# Altium footprint library lib_datalogger.PcbLib: 866 footprints (part 18 of 55)
Each footprint in its own frame and in the unit in brackets; x right, y up, seen from the top. Pads: shape width x height; smd on the part's side, far side on the other; paste and mask are expansions set on the pad; w line width, h text height; cw(c..) or ccw(c..) is an arc to the next point about the centre after c.
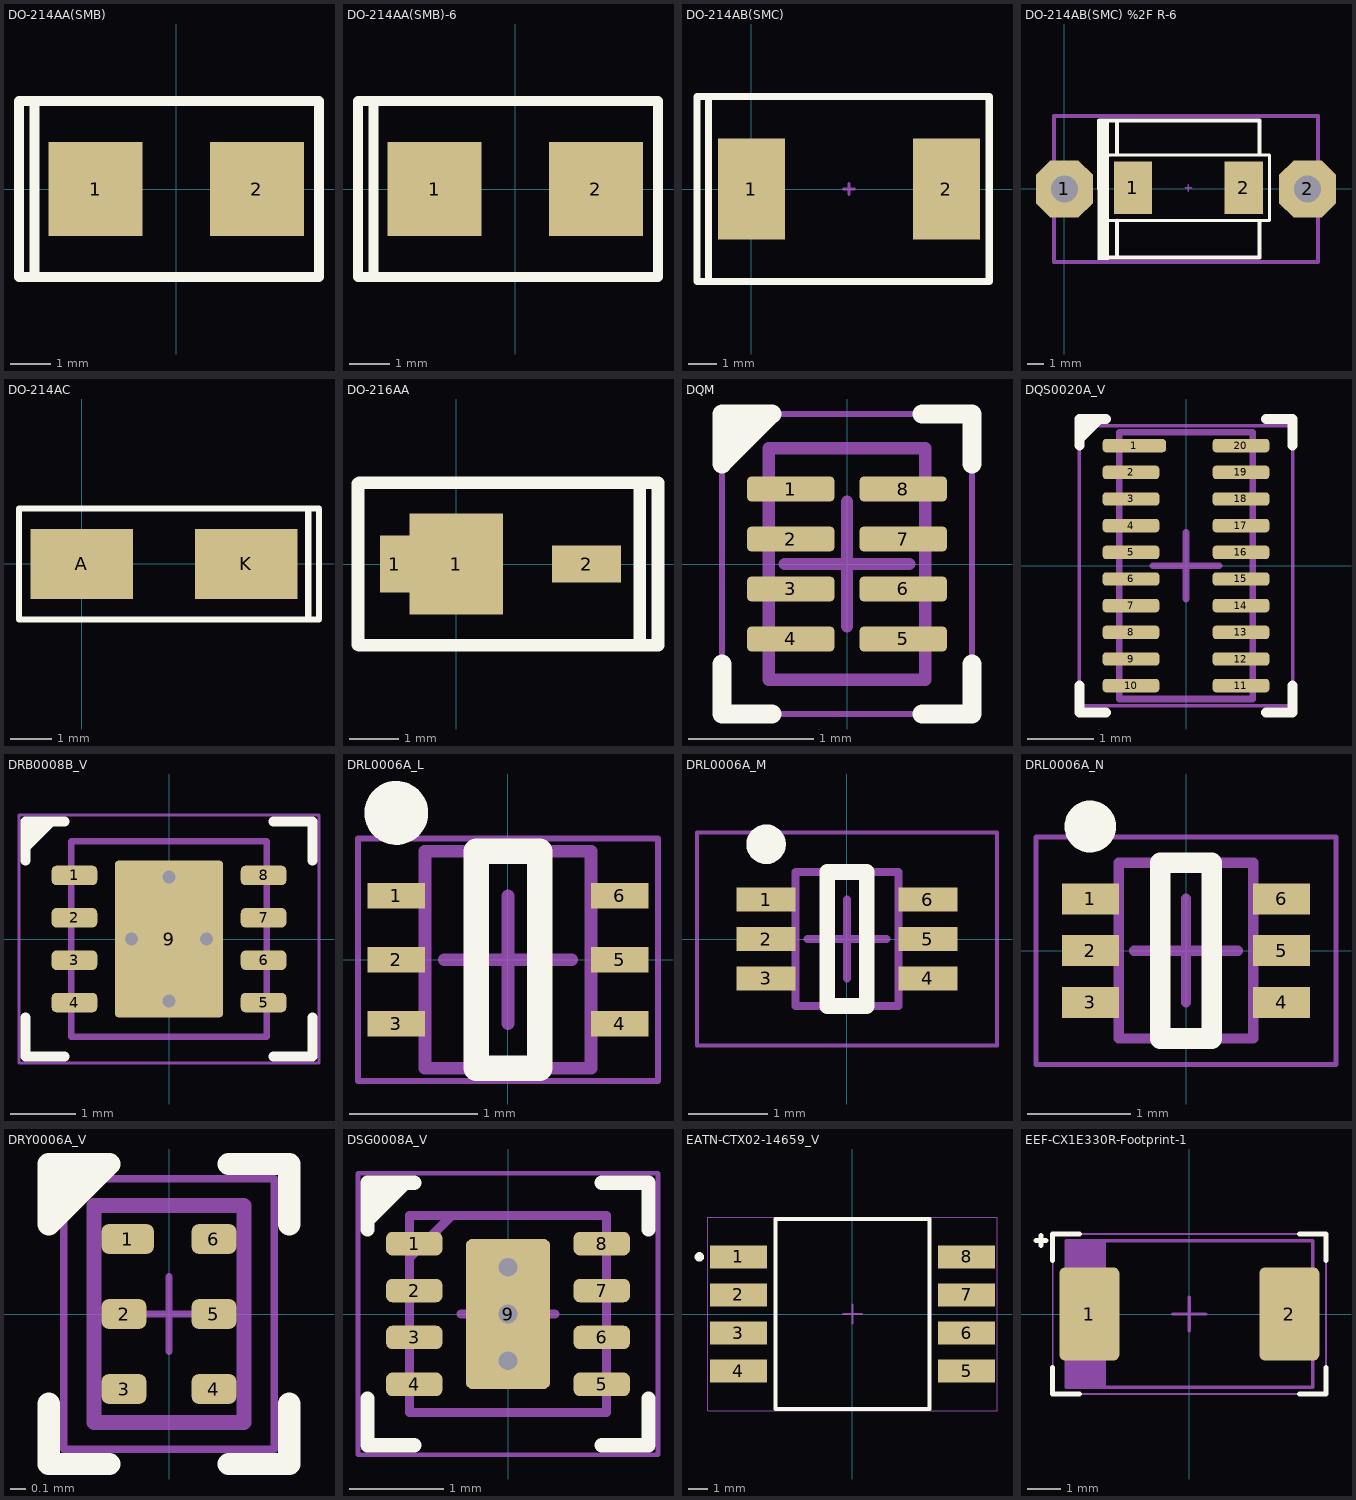
[diagram p17: the footprints below, top view; thin cyan lines are the x and y axes]

## DO-214AA(SMB) [mm]
pads (2):
  rect 2.3x2.3 smd: 1(-1.981,0) 2(1.981,0)
Top Overlay:
  lines w0.254: -3.48,-2.032 -3.48,2.032 ; -3.861,-2.159 -3.861,2.159 3.505,2.159 3.505,-2.159 -3.861,-2.159
3D body "DO-214AA.step": height 2.45, standoff 0.03, extent -2.674,-1.95 2.826,1.95

## DO-214AA(SMB)-6 [mm]
pads (2):
  rect 2.3x2.3 smd: 1(-1.981,0) 2(1.981,0)
Top Overlay:
  lines w0.254: -3.48,-2.032 -3.48,2.032 ; -3.861,-2.159 3.505,-2.159 3.505,2.159 -3.861,2.159 -3.861,-2.159
3D body "DO-214AA.step": height 2.45, standoff 0.03, extent -2.674,-1.95 2.826,1.95

## DO-214AB(SMC) [mm]
pads (2):
  rect 2.4x3.6 smd: 1(0,0) 2(6.95,0)
Top Overlay:
  lines w0.254: -1.524,-3.302 -1.524,3.302 ; -1.94,-3.302 8.474,-3.302 8.474,3.302 -1.94,3.302 -1.94,2.032 -1.94,-2.032 -1.94,-3.302
Mechanical 1:
  lines w0.1: 3.275,0 3.675,0 ; 3.475,-0.2 3.475,0.2
3D body "smc.step": height 2.4, standoff 0.03, extent -0.59,-3.05 7.54,3.05

## DO-214AB(SMC) %2F R-6 [mil]
pads (4):
  oct 140x140 hole 66: 1(0,0) 2(600,0)
  rect 94.49x129.92 smd: 1(169.19,3) 2(442.81,3)
Top Layer:
  lines w10: 130,-79 131,-78
Top Overlay:
  region: 110,171 110,-174 82,-174 81,171
  lines w7.87: 110.13,-77.91 92.42,-59.99 92.42,65.99 110.13,83.71 212.5,83.71 ; 110.13,-77.71 403,-77.71 ; 210,83.71 505.8,83.71 505.8,-77.71 399.5,-77.71
  lines w10: 86,169 479,169 ; 94,-169 481,-169 481,-79 ; 130,-169 130,-79 ; 130,85 130,169 ; 481,86 481,169
Mechanical 1:
  lines w3.94: 298.13,3 313.87,3 ; 306,-4.87 306,10.87
  lines w10: -25.59,-179.53 625.59,-179.53 625.59,179.52 -25.59,179.52 -25.59,-179.53
3D body "smc.step": height 94.49, standoff 1.29, extent 145.96,-117.08 466.04,123.08
3D body "User Library-Diode R-6 diameter 9_1 pitch 600mils.step": height 494.49, standoff -84.65, extent -25.59,-179.53 625.59,179.52

## DO-214AC [mm] "RM2000E-TP FOOTPRINT"
height 2.44
pads (2):
  rect 2.5x1.7 smd: A(0,0) K(4,0)
Top Overlay:
  lines w0.152: 5.509,-1.34 5.509,1.342 ; -1.524,-1.35 5.769,-1.35 5.769,1.35 -1.524,1.35 -1.524,-1.35
3D body "User Library-DO-214AC_SMA.STEP": height 2.15, standoff -0.05, extent -0.468,-1.35 4.532,1.35

## DO-216AA [mm]
pads (3):
  rect 0.6x1.15 smd: 1(-1.245,0)
  rect 1.9x2.05 smd: 1(0,0)
  rect 1.4x0.75 smd: 2(2.64,0)
Top Overlay:
  lines w0.254: -1.995,-1.639 -1.995,1.626 ; -1.969,-1.651 3.708,-1.651 ; -1.969,1.651 4.089,1.651 4.089,-1.651 3.72,-1.651 3.72,1.639 3.72,-1.626 ; 1.397,1.651 3.708,1.651
3D body "DO-216AA.step": height 1.01, standoff 0, extent -1.056,-1 2.794,1

## DQM [mm] "R-PX2SON-N8"
height 0.4
pads (8):
  rrect36% 0.7x0.2 smd paste+0 mask+0.05: 1(-0.45,0.6) 2(-0.45,0.2) 3(-0.45,-0.2) 4(-0.45,-0.6) 5(0.45,-0.6) 6(0.45,-0.2) 7(0.45,0.2) 8(0.45,0.6)
Top Overlay:
  region: -1,1.2 -1,0.8 -0.6,1.2
  lines w0.15: -1,-0.8 -1,-1.2 -0.6,-1.2 ; 0.6,-1.2 1,-1.2 1,-0.8 ; 0.6,1.2 1,1.2 1,0.8 ; -1,0.8 -1,1.2 -0.6,1.2 -1,0.8 ; -1,0.8 -1,0.8
Mechanical 13:
  lines w0.1: -0.625,-0.925 0.625,-0.925 0.625,0.925 -0.625,0.925 -0.625,-0.925
Mechanical 15:
  lines w0.05: -1,-1.2 -1,1.2 1,1.2 1,-1.2 -1,-1.2
  lines w0.1: -0.5,0 0.5,0 ; 0,-0.5 0,0.5
Top Designator:
  text ".Designator" at -1.27,-0.127 h0.6
3D body: height 0.35, standoff 0.05, extent -0.625,-0.925 0.625,0.925

## DQS0020A_V [mm] "SON, 20-Leads, Body 4x2mm, Pitch 0.4mm"
height 0.55
pads (20):
  rrect50% 0.95x0.2 smd: 1(-0.775,1.8)
  rrect50% 0.85x0.2 smd: 2(-0.825,1.4) 3(-0.825,1) 4(-0.825,0.6) 5(-0.825,0.2) 6(-0.825,-0.2) 7(-0.825,-0.6) 8(-0.825,-1) 9(-0.825,-1.4) 10(-0.825,-1.8) 11(0.825,-1.8) 12(0.825,-1.4) 13(0.825,-1) 14(0.825,-0.6) 15(0.825,-0.2) 16(0.825,0.2) 17(0.825,0.6) 18(0.825,1) 19(0.825,1.4) 20(0.825,1.8)
Top Overlay:
  region: -1.6,2.2 -1.6,1.9 -1.3,2.2
  lines w0.15: -1.6,-1.8 -1.6,-2.2 -1.2,-2.2 ; -1.3,2.2 -1.6,1.9 ; -1.2,2.2 -1.6,2.2 -1.6,1.8 ; 1.2,-2.2 1.6,-2.2 1.6,-1.8 ; 1.2,2.2 1.6,2.2 1.6,1.8 ; -1.6,1.8 -1.6,1.8 ; -1.6,1.9 -1.6,1.9
Mechanical 13:
  lines w0.1: -1,-2 1,-2 1,2 -1,2 -1,-2
Mechanical 15:
  lines w0.05: -1.6,-2.1 1.6,-2.1 1.6,2.1 -1.6,2.1 -1.6,-2.1
  lines w0.1: -0.5,0 0.5,0 ; 0,-0.5 0,0.5
Top Designator:
  text ".Designator" at -0.254,1.27 h0.6
3D body "USON20.STEP": height 0.5, standoff -0.05, extent -1.001,-2 1.001,2

## DRB0008B_V [mm] "SON, 8-Leads, Body 3x3mm, Pitch 0.65mm, Thermal Pad 2.4x1.65mm, TI Recommended"
height 1
pads (9):
  rrect50% 0.7x0.3 smd: 1(-1.45,0.975) 2(-1.45,0.325) 3(-1.45,-0.325) 4(-1.45,-0.975) 5(1.45,-0.975) 6(1.45,-0.325) 7(1.45,0.325) 8(1.45,0.975)
  rrect5% 1.65x2.4 smd paste-1.2: 9(0,0)
via -0.575,0 diameter 0.4 hole 0.2
via 0.575,0 diameter 0.4 hole 0.2
via 0,0.95 diameter 0.4 hole 0.2
via 0,-0.95 diameter 0.4 hole 0.2
Top Overlay:
  region: -1.8,1.8 -2.2,1.4 -2.2,1.8
  lines w0.15: -2.2,-1.2 -2.2,-1.8 -1.6,-1.8 ; -2.2,1.2 -2.2,1.8 -1.6,1.8 ; -2.2,1.4 -1.8,1.8 ; 1.6,-1.8 2.2,-1.8 2.2,-1.2 ; 1.6,1.8 2.2,1.8 2.2,1.2
Top Paste:
  rectangle: -0.751,0.1 0.752,1.143
  rectangle: -0.751,-1.143 0.752,-0.1
Mechanical 13:
  lines w0.1: -1.5,-1.5 1.5,-1.5 1.5,1.5 -1.5,1.5 -1.5,-1.5
Mechanical 15:
  lines w0.05: -2.3,-1.9 2.3,-1.9 2.3,1.9 -2.3,1.9 -2.3,-1.9
  lines w0.1: -0.5,0 0.5,0 ; 0,-0.5 0,0.5
Top Designator:
  text ".Designator" at -1.27,-0.127 h0.6
3D body "DRB0008B.stp": height 0.96, standoff 0.01, extent -1.5,-1.5 1.5,1.5

## DRL0006A_L [mm] "SOT23, 6-Leads, Body 1.7x1.3mm, Pitch 0.5mm, IPC High Density"
height 0.6
pads (6):
  rect 0.45x0.2 smd: 1(-0.875,0.5) 2(-0.875,0) 3(-0.875,-0.5) 4(0.875,-0.5) 5(0.875,0) 6(0.875,0.5)
Top Overlay:
  circle w0.25: c-0.875,1.15 r0.125
  lines w0.2: -0.25,-0.85 0.25,-0.85 0.25,0.85 -0.25,0.85 -0.25,-0.85
Mechanical 13:
  lines w0.1: -0.65,-0.85 -0.65,0.85 0.65,0.85 0.65,-0.85 -0.65,-0.85
Mechanical 15:
  lines w0.05: -1.175,-0.95 -1.175,0.95 1.175,0.95 1.175,-0.95 -1.175,-0.95
  lines w0.1: -0.5,0 0.5,0 ; 0,-0.5 0,0.5
3D body "SOTFL50P160X60-6L.step": height 0.6, standoff 0, extent -0.8,-0.848 0.8,0.848

## DRL0006A_M [mm] "SOT23, 6-Leads, Body 1.7x1.3mm, Pitch 0.5mm, IPC Low Density"
height 0.6
pads (6):
  rect 0.75x0.3 smd: 1(-1.025,0.5) 2(-1.025,0) 3(-1.025,-0.5) 4(1.025,-0.5) 5(1.025,0) 6(1.025,0.5)
Top Overlay:
  circle w0.25: c-1.025,1.2 r0.125
  lines w0.2: -0.25,-0.85 -0.25,0.85 0.25,0.85 0.25,-0.85 -0.25,-0.85
Mechanical 13:
  lines w0.1: -0.65,-0.85 0.65,-0.85 0.65,0.85 -0.65,0.85 -0.65,-0.85
Mechanical 15:
  lines w0.05: -1.9,-1.35 1.9,-1.35 1.9,1.35 -1.9,1.35 -1.9,-1.35
  lines w0.1: -0.5,0 0.5,0 ; 0,-0.5 0,0.5
3D body "SOTFL50P160X60-6N.step": height 0.6, standoff 0, extent -0.8,-0.848 0.8,0.848

## DRL0006A_N [mm] "SOT23, 6-Leads, Body 1.7x1.3mm, Pitch 0.5mm, IPC Medium Density"
height 0.6
pads (6):
  rect 0.55x0.3 smd: 1(-0.925,0.5) 2(-0.925,0) 3(-0.925,-0.5) 4(0.925,-0.5) 5(0.925,0) 6(0.925,0.5)
Top Overlay:
  circle w0.25: c-0.925,1.2 r0.125
  lines w0.2: -0.25,-0.85 -0.25,0.85 0.25,0.85 0.25,-0.85 -0.25,-0.85
Mechanical 13:
  lines w0.1: -0.65,-0.85 0.65,-0.85 0.65,0.85 -0.65,0.85 -0.65,-0.85
Mechanical 15:
  lines w0.05: -1.45,-1.1 1.45,-1.1 1.45,1.1 -1.45,1.1 -1.45,-1.1
  lines w0.1: -0.5,0 0.5,0 ; 0,-0.5 0,0.5
3D body "SOTFL50P160X60-6N.step": height 0.6, standoff 0, extent -0.8,-0.848 0.8,0.848

## DRY0006A_V [mm] "SON, 6-Leads, Body 1.45x1mm, Pitch 0.5mm"
height 0.6
pads (6):
  rrect50% 0.35x0.2 smd: 1(-0.275,0.5)
  rrect50% 0.3x0.2 smd: 2(-0.3,0) 3(-0.3,-0.5) 4(0.3,-0.5) 5(0.3,0) 6(0.3,0.5)
Top Overlay:
  region: -0.8,1 -0.8,0.6 -0.4,1
  lines w0.15: -0.8,-0.6 -0.8,-1 -0.4,-1 ; 0.4,-1 0.8,-1 0.8,-0.6 ; 0.4,1 0.8,1 0.8,0.6 ; -0.8,0.6 -0.4,1 -0.8,1 -0.8,0.6
Mechanical 13:
  lines w0.1: -0.5,-0.725 0.5,-0.725 0.5,0.725 -0.5,0.725 -0.5,-0.725
Mechanical 15:
  lines w0.05: -0.25,0 0.25,0 ; 0,-0.25 0,0.25 ; -0.7,-0.9 0.7,-0.9 0.7,0.9 -0.7,0.9 -0.7,-0.9
Top Designator:
  text ".Designator" at -1.27,-0.127 h0.6
3D body "USON-6.STEP": height 0.51, standoff 0, extent -0.5,-0.75 0.5,0.75

## DSG0008A_V [mm] "SON, 8-Leads, Body 2x2mm, Pitch 0.5mm, Thermal Pad 1.6x0.9mm, TI Recommended"
height 0.8
pads (9):
  rrect50% 0.6x0.25 smd: 1(-1,0.75) 2(-1,0.25) 3(-1,-0.25) 4(-1,-0.75) 5(1,-0.75) 6(1,-0.25) 7(1,0.25) 8(1,0.75)
  rrect15% 0.9x1.6 smd paste-0.45: 9(0,0)
via 0,0 diameter 0.4 hole 0.2
via 0,-0.5 diameter 0.4 hole 0.2
via 0,0.5 diameter 0.4 hole 0.2
Top Overlay:
  region: -1.5,1.4 -1.5,1 -1.1,1.4
  lines w0.15: -1.5,-0.9 -1.5,-1.4 -1,-1.4 ; -1.5,0.9 -1.5,1.4 -1,1.4 ; -1.5,1 -1.1,1.4 ; 1,-1.4 1.5,-1.4 1.5,-0.9 ; 1,1.4 1.5,1.4 1.5,0.9
Top Paste:
  rectangle: -0.427,-0.733 0.427,0.733
Mechanical 13:
  lines w0.1: -1.05,0.6 -0.6,1.05 ; -1.05,-1.05 -1.05,1.05 1.05,1.05 1.05,-1.05 -1.05,-1.05
Mechanical 15:
  lines w0.05: -1.6,-1.5 1.6,-1.5 1.6,1.5 -1.6,1.5 -1.6,-1.5
  lines w0.1: -0.5,0 0.5,0 ; 0,-0.5 0,0.5
Top Designator:
  text ".Designator" at -1.27,-0.127 h0.6
3D body "WSON8-2x2mm-1.STEP": height 0.79, standoff -0.01, extent -1,-1 1,1

## EATN-CTX02-14659_V [mm] "SMT, 8-Leads, Body 10x8.1mm, Pitch 2mm"
height 6.2
pads (8):
  rect 3x1.2 smd: 1(-6,3) 2(-6,1) 3(-6,-1) 4(-6,-3) 5(6,-3) 6(6,-1) 7(6,1) 8(6,3)
Top Overlay:
  circle w0.25: c-8.05,3 r0.125
  lines w0.2: -4.05,-5 4.05,-5 4.05,5 -4.05,5 -4.05,-5
Mechanical 13:
  lines w0.1: -4.05,-5 4.05,-5 4.05,5 -4.05,5 -4.05,-5
Mechanical 15:
  lines w0.05: -7.6,-5.1 7.6,-5.1 7.6,5.1 -7.6,5.1 -7.6,-5.1
  lines w0.1: -0.5,0 0.5,0 ; 0,-0.5 0,0.5
3D body: height 6.2, standoff 0, extent -4.05,-5 4.05,5

## EEF-CX1E330R-Footprint-1 [mm]
pads (2):
  rrect20% 1.8x2.8 smd: 1(-3,0) 2(3,0)
Top Overlay:
  lines w0.15: -4.6,2.2 -4.3,2.2 ; -4.45,2.05 -4.45,2.35 ; -4.1,-1.6 -4.1,-2.4 -3.3,-2.4 ; -4.1,1.6 -4.1,2.4 -3.3,2.4 ; 3.3,-2.4 4.1,-2.4 4.1,-1.6 ; 3.3,2.4 4.1,2.4 4.1,1.6
Mechanical 13:
  rectangle: -3.7,-2.2 -2.5,2.2
  lines w0.1: -3.7,-2.2 -3.7,2.2 3.7,2.2 3.7,-2.2 -3.7,-2.2
Mechanical 15:
  lines w0.05: -4.1,-2.4 -4.1,2.4 4.1,2.4 4.1,-2.4 -4.1,-2.4
  lines w0.1: -0.5,0 0.5,0 ; 0,-0.5 0,0.5
Top Designator:
  text ".Designator" at -1.27,-0.127 h0.6
3D body "SP-CAP.STEP": height 1.85, standoff 0, extent -3.7,-2.15 3.7,2.15